# Altium footprint library PLC1.PcbLib: 118 footprints (part 7 of 8)
Each footprint in its own frame and in the unit in brackets; x right, y up, seen from the top. Pads: shape width x height; smd on the part's side, far side on the other; paste and mask are expansions set on the pad; w line width, h text height; cw(c..) or ccw(c..) is an arc to the next point about the centre after c.
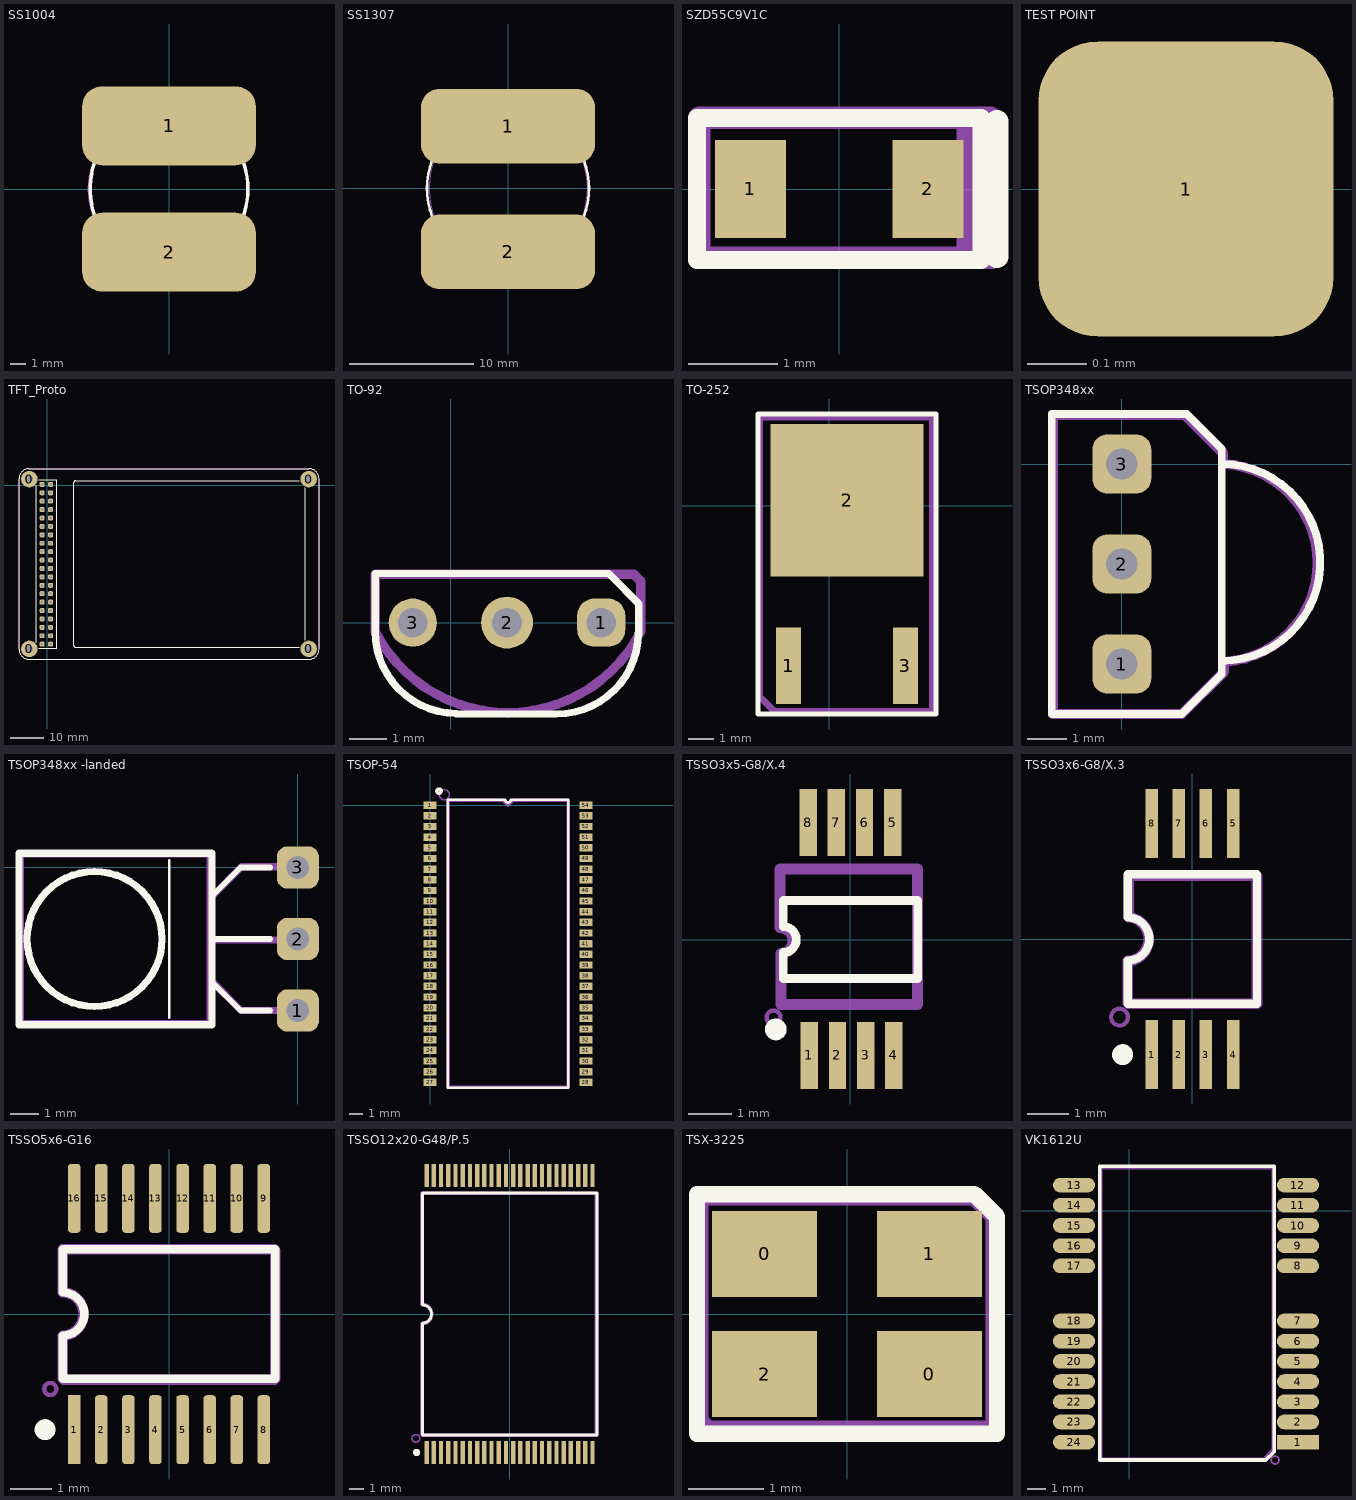
[diagram p6: the footprints below, top view; thin cyan lines are the x and y axes]

## SS1004 [mm] "Chip Inductor, Body o10mm"
height 4.5
pads (2):
  rrect50% 11x5 smd: 1(0,4) 2(0,-4)
Top Overlay:
  circle w0.22: c0,0 r5
Top Assy:
  circle w0.1: c-0.025,0 r5.076
  text ".Designator" at -4.475,-0.425 h0.7
3D body "Probe2.step": height 7, standoff 0, extent -5.36,-5.492 5.403,5.293

## SS1307 [mm] "Chip Inductor, Body o13mm"
height 4
pads (2):
  rrect50% 14x6 smd: 1(0,5) 2(0,-5.1)
Top Overlay:
  circle w0.22: c0,0 r6.5
Top Assy:
  circle w0.1: c0.025,0 r6.362
  text ".Designator" at -3.575,-0.325 h0.7
3D body "Probe.step": height 7, standoff 0, extent -6.571,-6.409 6.423,6.61

## SZD55C9V1C [mm] "Zener 0805"
height 1
pads (2):
  rect 0.8x1.1 smd: 1(-1,0) 2(1,0)
Top Overlay:
  lines w0.2: -1.6,-0.8 1.6,-0.8 1.6,0.8 -1.6,0.8 -1.6,-0.117 -1.6,-0.8
  lines w0.254: 1.778,-0.762 1.778,0.762
Top Assy:
  lines w0.254: 1.225,0.8 1.7,0.8 1.775,0.725 1.775,-0.725 1.725,-0.775 1.475,-0.775 ; -1.575,-0.75 -1.55,-0.775 1.45,-0.775 1.45,0.8 -1.575,0.8 -1.575,-0.75
  text ".Designator" at -1.3,-0.425 h0.7
3D body "User Library-R_0805.step": height 0.5, standoff 0, extent -1,-0.625 1,0.625

## TEST POINT [mm] "TEST POINT"
height 0.5
pads (1):
  rrect40% 0.5x0.5 smd: 1(-1,0)

## TFT_Proto [mm]
pads (44):
  round 5 hole 2.2: 0(-5.4,-49.4) 0(-5.4,1.9) 0(79,-49.4) 0(79,1.9)
  rrect50% 1.5x1.5 hole 0.9: 1(-1.5,0.3) 2(1.04,0.3) 3(-1.5,-2.24) 4(1.04,-2.24) 5(-1.5,-4.78) 6(1.04,-4.78) 7(-1.5,-7.32) 8(1.04,-7.32) 9(-1.5,-9.86) 10(1.04,-9.86) 11(-1.5,-12.4) 12(1.04,-12.4) 13(-1.5,-14.94) 14(1.04,-14.94) 15(-1.5,-17.48) 16(1.04,-17.48) 17(-1.5,-20.02) 18(1.04,-20.02) 19(-1.5,-22.56) 20(1.04,-22.56) 21(-1.5,-25.1) 22(1.04,-25.1) 23(-1.5,-27.64) 24(1.04,-27.64) 25(-1.5,-30.18) 26(1.04,-30.18) 27(-1.5,-32.72) 28(1.04,-32.72) 29(-1.5,-35.26) 30(1.04,-35.26) 31(-1.5,-37.8) 32(1.04,-37.8) 33(-1.5,-40.34) 34(1.04,-40.34) 35(-1.5,-42.88) 36(1.04,-42.88) 37(-1.5,-45.42) 38(1.04,-45.42) 39(-1.5,-47.96) 40(1.04,-47.96)
Top Overlay:
  lines w0.2: -3.405,0 -3.4,-47.5 ; -2.6,-49.23 -0.23,-49.23 2.945,-49.23 2.945,-8.59 2.945,1.697 -2.6,1.697
  lines w0.254: 76.2,-48.9 8.6,-48.9 cw(c8.6,-48.3) 8,-48.3 8,0.8 cw(c8.6,0.8) 8.6,1.4 76.2,1.4 ; 77.9,-46.8 77.9,-0.7 ; 71.4,-52.5 -5.5,-52.5 cw(c-5.5,-49.5) -8.5,-49.5 -8.5,2 cw(c-5.5,2) -5.5,5 79.1,5 cw(c79.1,2) 82.1,2 82.1,-49.5 cw(c79.1,-49.5) 79.1,-52.5 71.4,-52.5 ; 71.4,-52.5 71.4,-52.5
Top Assy:
  lines w0.254: -8.5,-49.625 -8.5,2.125 ; -5.65,-52.5 79.225,-52.5 ; -5.6,5 79.175,5 ; 82.1,-49.55 82.1,2.125
  text ".Designator" at 32.775,-24.95 h0.7

## TO-92 [mm] "TO-92 3-pins"
height 10
pads (3):
  rrect70% 1.3x1.3 hole 0.8: 1(4.064,0)
  round 1.4 hole 0.8: 2(1.524,0)
  round 1.3 hole 0.8: 3(-1.016,0)
Top Overlay:
  lines w0.2: 0.153,-2.452 cw(c0.178,-0.241) -2.032,-0.241 -2.032,0.859 -2.032,1.325 4.263,1.325 4.318,1.27 5.08,0.508 5.08,-0.296 ; 0.165,-2.464 2.857,-2.464 ccw(c2.857,-0.253) 5.068,-0.279
Top Assy:
  lines w0.254: -2.025,-0.25 ccw(c1.55,1.601) 5.125,-0.25 5.125,1.125 4.95,1.3 -2.025,1.3 -2.025,-0.25
  text ".Designator" at -1.5,-0.225 h0.7
3D body "User Library-TO-92_Bent.STEP": height 11.3, standoff -1.7, extent -1.266,-2.613 4.314,1.59

## TO-252 [mm] "TO252"
pads (3):
  rect 1x3 smd: 1(-1.6,-6.3) 3(3,-6.3)
  rect 6x6 smd: 2(0.7,0.2)
Top Overlay:
  lines w0.2: -2.8,-8.2 4.2,-8.2 4.2,3.6 -1.376,3.6 -2.219,3.6 -2.8,3.6 -2.8,-8.2
Top Assy:
  lines w0.254: -2.725,-7.525 -2.725,3.475 4.075,3.475 4.05,3.45 4.05,-8.1 -2.15,-8.1 -2.25,-8 -2.425,-7.825 -2.725,-7.525
  text ".Designator" at -1.5,-3.25 h0.7

## TSOP348xx [mm]
pads (3):
  rrect50% 1.5x1.5 hole 0.8: 1(0,-5.08) 2(0,-2.54) 3(0,0)
Top Overlay:
  lines w0.2: 2.54,-5 ccw(c2.54,-2.5) 2.54,0 ; -1.778,-6.35 -1.778,1.27 1.651,1.27 1.968,0.953 2.222,0.699 2.54,0.381 2.54,-5.334 1.524,-6.35 -1.778,-6.35
Top Assy:
  lines w0.254: -1.75,-6.35 -1.75,1.2 -1.7,1.25 1.6,1.25 2.575,0.275 2.575,0.025 2.6,0 cw(c2.459,-2.512) 2.6,-5.025 2.6,-5.275 1.525,-6.35 -1.75,-6.35
  text ".Designator" at 0.575,-5.95 h0.7

## TSOP348xx -landed [mm]
pads (3):
  rrect50% 1.5x1.5 hole 0.8: 1(0,-5.08) 2(0,-2.54) 3(0,0)
Top Overlay:
  circle w0.254: c-7.222,-2.54 r2.396
  lines w0.1: -4.572,-5.334 -4.572,0.254
  lines w0.2: -3.048,-4.064 -2.032,-5.08 -0.976,-5.08 ; -3.048,-2.54 -0.976,-2.54 ; -3.048,-1.016 -2.032,0 -0.976,0
  lines w0.254: -9.906,-5.588 -9.906,0.508 -3.048,0.508 -3.048,-5.588 -9.906,-5.588
Top Assy:
  circle w0.1: c-7.275,-2.5 r2.407
  lines w0.1: -9.55,-1.85 cw(c-7.225,-2.588) -4.925,-1.775 ; -9.525,-3.225 ccw(c-7.2,-2.487) -4.9,-3.3
  lines w0.254: -3.125,-4.025 -3.075,-4.025 -2.025,-5.075 -0.425,-5.075 -0.325,-4.975 ; -3.125,-2.575 -0.5,-2.575 -0.425,-2.5 ; -3.075,-0.975 -3,-0.975 -2,0.025 -0.35,0.025 ; -9.85,-5.525 -9.825,-5.55 -3.175,-5.55 -3.125,-5.5 -3.125,0.425 -3.175,0.475 -9.85,0.475 -9.85,-5.525
  text ".Designator" at -9.575,-2.625 h0.7

## TSOP-54 [mm]
pads (54):
  rect 1x0.55 smd: 1(0,0) 2(0,-0.8) 3(0,-1.6) 4(0,-2.4) 5(0,-3.2) 6(0,-4) 7(0,-4.8) 8(0,-5.6) 9(0,-6.4) 10(0,-7.2) 11(0,-8) 12(0,-8.8) 13(0,-9.6) 14(0,-10.4) 15(0,-11.2) 16(0,-12) 17(0,-12.8) 18(0,-13.6) 19(0,-14.4) 20(0,-15.2) 21(0,-16) 22(0,-16.8) 23(0,-17.6) 24(0,-18.4) 25(0,-19.2) 26(0,-20) 27(0,-20.8) 28(11.7,-20.8) 29(11.7,-20) 30(11.7,-19.2) 31(11.7,-18.4) 32(11.7,-17.6) 33(11.7,-16.8) 34(11.7,-16) 35(11.7,-15.2) 36(11.7,-14.4) 37(11.7,-13.6) 38(11.7,-12.8) 39(11.7,-12) 40(11.7,-11.2) 41(11.7,-10.4) 42(11.7,-9.6) 43(11.7,-8.8) 44(11.7,-8) 45(11.7,-7.2) 46(11.7,-6.4) 47(11.7,-5.6) 48(11.7,-4.8) 49(11.7,-4) 50(11.7,-3.2) 51(11.7,-2.4) 52(11.7,-1.6) 53(11.7,-0.8) 54(11.7,0)
Top Overlay:
  circle w0.254: c0.675,1.05 r0.16
  lines w0.2: 1.335,-21.2 10.365,-21.2 10.365,0.4 6.05,0.4 cw(c5.85,0.4) 5.65,0.4 1.335,0.4 1.335,-21.2
Top Assy:
  circle w0.1: c1.075,0.775 r0.382
  lines w0.254: 1.375,-21.15 10.375,-21.15 10.375,0.325 10.325,0.375 6.25,0.375 5.875,0 5.85,0 5.475,0.375 1.375,0.375 1.375,-0.125 1.375,-21.15
  text ".Designator" at 2.975,-8.625 h0.7
3D body "SW3dPS-TSOP2-54.STEP": height 1.3, standoff -0.4, extent -0.004,-21.534 11.756,0.686

## TSSO3x5-G8/X.4 [mm] "Shrink Small Outline, MSOP; 8 Leads; Body Width 3 mm; Pitch 0.65 mm"
height 1.1
pads (8):
  rect 0.4x1.55 smd: 1(-0.95,-2.675) 2(-0.3,-2.675) 3(0.35,-2.675) 4(1,-2.675) 5(0.975,2.7) 6(0.325,2.7) 7(-0.325,2.7) 8(-0.975,2.7)
Top Overlay:
  circle w0.25: c-1.725,-2.075 r0.125
  lines w0.2: -1.55,-0.9 1.55,-0.9 1.55,0.9 -1.55,0.9 -1.55,0.3 cw(c-1.55,0) -1.55,-0.3 -1.55,-0.9
Top Assy:
  circle w0.1: c-1.775,-1.8 r0.16
  lines w0.254: -1.575,-1.475 -1.6,-1.5 ; -1.6,-1.5 -1.6,-0.325 ccw(c-1.626,-0.026) -1.625,0.275 -1.625,1.625 1.55,1.625 ; -1.6,-1.5 1.55,-1.5 1.55,1.625 ; 1.55,1.625 1.55,1.625
  text ".Designator" at -1.2,-0.55 h0.7
3D body "User Library-TSSOP8.step": height 1.15, standoff -0.05, extent -1.525,-3.2 1.575,3.2

## TSSO3x6-G8/X.3 [mm] "Shrink Small Outline; 8 Leads; Body Width 4.4 mm; Pitch 0.65 mm"
height 1.2
pads (8):
  rect 0.3x1.65 smd: 1(-0.975,-2.775) 2(-0.325,-2.775) 3(0.325,-2.775) 4(0.975,-2.775) 5(0.975,2.775) 6(0.325,2.775) 7(-0.325,2.775) 8(-0.975,2.775)
Top Overlay:
  circle w0.25: c-1.675,-2.775 r0.125
  lines w0.2: -1.55,-1.55 1.55,-1.55 1.55,1.55 -1.55,1.55 -1.55,0.517 cw(c-1.55,0) -1.55,-0.517 -1.55,-1.55
Top Assy:
  circle w0.1: c-1.75,-1.875 r0.202
  lines w0.254: -1.55,-0.525 -1.55,-1.525 -1.525,-1.55 1.55,-1.55 1.55,1.5 1.525,1.525 -1.525,1.525 -1.525,0.525 cw(c-1.579,-0.002) -1.5,-0.525
  text ".Designator" at -1.3,-1.175 h0.7

## TSSO5x6-G16 [mm] "Shrink Small Outline; 16 Leads; Body Width 4.4 mm; Pitch 0.65 mm"
height 1.1
pads (16):
  rect 0.3x1.65 smd: 1(-2.275,-2.775)
  rrect50% 0.3x1.65 smd: 2(-1.625,-2.775) 3(-0.975,-2.775) 4(-0.325,-2.775) 5(0.325,-2.775) 6(0.975,-2.775) 7(1.625,-2.775) 8(2.275,-2.775) 9(2.275,2.775) 10(1.625,2.775) 11(0.975,2.775) 12(0.325,2.775) 13(-0.325,2.775) 14(-0.975,2.775) 15(-1.625,2.775) 16(-2.275,2.775)
Top Overlay:
  circle w0.25: c-2.975,-2.775 r0.125
  lines w0.2: -2.55,-1.55 2.55,-1.55 2.55,1.55 -2.55,1.55 -2.55,0.517 cw(c-2.55,0) -2.55,-0.517 -2.55,-1.55
Top Assy:
  circle w0.1: c-2.85,-1.8 r0.146
  lines w0.254: -2.55,-1.55 -2.525,-1.575 2.525,-1.575 2.55,-1.55 2.55,1.525 2.525,1.55 -2.55,1.55 -2.55,0.525 cw(c-2.576,0) -2.55,-0.525 -2.55,-1.55
  text ".Designator" at -2.3,-1.075 h0.7
3D body "User Library-TSSOP-16.step": height 1, standoff 0, extent -2.5,-3.175 2.5,3.225

## TSSO12x20-G48/P.5 [mm] "Shrink Small Outline; 48 Leads; Body Width 18.4 mm; Pitch 0.5 mm"
height 1.2
pads (48):
  rect 0.3x1.6 smd: 1(-5.75,-9.6) 2(-5.25,-9.6) 3(-4.75,-9.6) 4(-4.25,-9.6) 5(-3.75,-9.6) 6(-3.25,-9.6) 7(-2.75,-9.6) 8(-2.25,-9.6) 9(-1.75,-9.6) 10(-1.25,-9.6) 11(-0.75,-9.6) 12(-0.25,-9.6) 13(0.25,-9.6) 14(0.75,-9.6) 15(1.25,-9.6) 16(1.75,-9.6) 17(2.25,-9.6) 18(2.75,-9.6) 19(3.25,-9.6) 20(3.75,-9.6) 21(4.25,-9.6) 22(4.75,-9.6) 23(5.25,-9.6) 24(5.75,-9.6) 25(5.75,9.6) 26(5.25,9.6) 27(4.75,9.6) 28(4.25,9.6) 29(3.75,9.6) 30(3.25,9.6) 31(2.75,9.6) 32(2.25,9.6) 33(1.75,9.6) 34(1.25,9.6) 35(0.75,9.6) 36(0.25,9.6) 37(-0.25,9.6) 38(-0.75,9.6) 39(-1.25,9.6) 40(-1.75,9.6) 41(-2.25,9.6) 42(-2.75,9.6) 43(-3.25,9.6) 44(-3.75,9.6) 45(-4.25,9.6) 46(-4.75,9.6) 47(-5.25,9.6) 48(-5.75,9.6)
Top Overlay:
  circle w0.25: c-6.45,-9.6 r0.125
  lines w0.2: -6.05,-8.4 -6.05,-0.635 ccw(c-6.05,0) -6.05,0.635 -6.05,8.4 6.05,8.4 6.05,-8.4 -6.05,-8.4
Top Assy:
  circle w0.1: c-6.5,-8.625 r0.27
  lines w0.254: -6.075,-8.35 -6.075,-0.675 ccw(c-6.075,0) -6.075,0.675 -6.075,8.375 6,8.375 6.025,8.35 6.025,-8.4 -6.025,-8.4 -6.075,-8.35
  text ".Designator" at -3.15,-0.25 h0.7
3D body "User Library-TSOP48.step": height 1.2, standoff -0.06, extent -6.05,-10.05 6.05,10.05

## TSX-3225 [mm]
height 1.5
pads (4):
  rect 1.4x1.15 smd: 0(-1.1,0.8) 0(1.1,-0.8) 1(1.1,0.8) 2(-1.1,-0.8)
Top Overlay:
  lines w0.22: -2,-1.6 -2,1.6 1.7,1.6 2,1.3 2,-1.6 -2,-1.6
Top Assy:
  lines w0.254: -1.975,-1.425 -1.975,1.575 1.7,1.575 1.975,1.3 1.975,-1.5 1.925,-1.55 -1.85,-1.55 -1.975,-1.425
  text ".Designator" at -1.725,-0.275 h0.7
3D body "User Library-tsx-3225-1.step": height 0.6, standoff 0, extent -1.625,-1.25 1.575,1.25

## VK1612U [mm]
pads (24):
  rect 2.3x0.8 smd: 1(9.2,-12.6)
  oval 2.3x0.8 smd: 2(9.2,-11.5) 3(9.2,-10.4) 4(9.2,-9.3) 5(9.2,-8.2) 6(9.2,-7.1) 7(9.2,-6) 8(9.2,-3) 9(9.2,-1.9) 10(9.2,-0.8) 11(9.2,0.3) 12(9.2,1.4) 13(-3,1.4) 14(-3,0.3) 15(-3,-0.8) 16(-3,-1.9) 17(-3,-3) 18(-3,-6) 19(-3,-7.1) 20(-3,-8.2) 21(-3,-9.3) 22(-3,-10.4) 23(-3,-11.5) 24(-3,-12.6)
Top Overlay:
  lines w0.2: -1.6,-13.575 -1.6,2.425 0.85,2.425 5.45,2.425 7.9,2.425 7.9,-13.125 7.45,-13.575 -1.6,-13.575
Top Assy:
  circle w0.1: c7.95,-13.575 r0.215
  lines w0.254: -1.575,2.325 -1.575,-13.525 -1.55,-13.55 7.35,-13.55 7.875,-13.025 7.875,2.35 7.85,2.375 -1.525,2.375
  text ".Designator" at 3.425,-10.3 h0.7
3D body "User Library-neo-m8n.step": height 2.4, standoff 0, extent -2.9,-13.6 9.3,2.4